# Altium schematic symbol library Analog Devices Data Converters Digital-to-Analog Converters.SchLib: 2231 symbols (part 80 of 135) (continued)
## AD5754RBREZ (continued)

## AD5754RBREZ-REEL7
designator U?
Quad 16-Bit Unipolar / Bipolar Voltage Output Digital-to-Analog Converter with Serial Interface, -40 to +85 degC, RE-24, Pb-Free, Reel; Generic Part Number: AD5754R; Manufacturer: Analog Devices; PartNumber: AD5754RBREZ-REEL7; # DAC Outputs: 4; Max V+: 16.5V; Op Pwr Diss: 310mW; Resolution (Bits): 16; Settling Time: 10µs; Single Supply: Yes; DatasheetVersion: Rev.E; PackageVersion: 050806-A; PackageReference: RE-24; PackageDescription: 24-Lead Thin Shrink Small Outline Package, Exposed Pad [TSSOP_EP]; Supplier 1: Digi-Key; Supplier Part Number 1: AD5754RBREZ-REEL7-ND; Supplier 2: Newark; Supplier Part Number 2: 51P3756; Supplier 3: Mouser; Supplier Part Number 3: 584-AD5754RBREZ-R7; Packing: Reel; RoHS: Y; Mounting Technology: Surface Mount; Code_JEDEC: MO-153-ADT; ComponentLink1Description: Manufacturer URL; ComponentLink1URL: http://www.analog.com/en/index.html; ComponentLink2Description: Datasheet; ComponentLink2URL: http://www.analog.com/static/imported-files/data_sheets/AD5724R_5734R_5754R.pdf; ComponentLink3Description: Package Specification; ComponentLink3URL: http://www.analog.com/static/imported-files/packages/PKG_PDF/TSSOP_EP(RE)/RE_24.pdf; ComponentLink4Description: Product URL; ComponentLink4URL: http://www.analog.com/en/digital-to-analog-converters/da-converters/ad5754r/products/product.html; ComponentLink5Description: Reference Design URL; ComponentLink5URL: http://www.analog.com/en/digital-to-analog-converters/da-converters/ad5754r/products/product.html#prod_cross_sell
footprint RE-24_N (TSOP, 24-Leads, Body 7.8x4.4mm, Pitch 0.65mm, Thermal pad 5.02x3.25 mm, IPC Medium Density)
footprint RE-24_L (TSOP, 24-Leads, Body 7.8x4.4mm, Pitch 0.65mm, Thermal pad 5.02x3.25 mm, IPC High Density)
footprint RE-24_M (TSOP, 24-Leads, Body 7.8x4.4mm, Pitch 0.65mm, Thermal pad 5.02x3.25 mm, IPC Low Density)
pins: 1 AVSS (power) "Negative Analog Supply Pin. Voltage range is from -4.5 V to -16.5 V. This pin can be connected to 0 V if output ranges are unipolar.", 2 NC "No Connect. Do not connect to these pins.", 3 VOUTA (out) "Analog Output Voltage of DAC A. The output amplifier is capable of directly driving a 2 kohm, 4000 pF load.", 4 VOUTB (out) "Analog Output Voltage of DAC B. The output amplifier is capable of directly driving a 2 kohm, 4000 pF load.", 5 BIN/~{2SCOMP} (in) "This pin determines the DAC coding for a bipolar output range. This pin should be hardwired to either DVCC or GND. When hardwired to DVCC, input coding is offset binary. When hardwired to GND, input coding is twos complement.(See Datasheet)", 6 NC "No Connect. Do not connect to these pins.", 7 ~{SYNC} (in) "Active Low Input. This is the frame Synchronization signal for the serial interface. While S\Y\N\C\ is low, data is transferred on the falling edge of SCLK. Data is latched on the rising edge of S\Y\N\C\.", 8 SCLK (in) "Serial Clock Input. Data is clocked into the shift register on the falling edge of SCLK. This operates at clock speeds up to 30 MHz.", 9 SDIN (in) "Serial Data Input. Data must be valid on the falling edge of SCLK.", 10 ~{LDAC} (in) "Load DAC, Logic Input. This is used to update the DAC registers and, consequently, the analog output. When tied permanently low, the addressed DAC register is updated on the rising edge of S\Y\N\C\. If L\D\A\C\ is held high (See Datasheet)", 11 ~{CLR} (in) "Active Low Input. Asserting this pin sets the DAC registers to zero-scale code or midscale code (user selectable).", 12 NC "No Connect. Do not connect to these pins.", 13 NC "No Connect. Do not connect to these pins.", 14 DVCC (power) "Digital Supply Pin. Voltage range is from 2.7 V to 5.5 V.", 15 GND (power) "Ground Reference Pin.", 16 SDO (out) "Serial Data Output. Used to clock data from the serial register in daisy-chain or readback mode. Data is clocked out on the rising edge of SCLK and is valid on the falling edge of SCLK.", 17 REFIN/REFOUT (io) "External Reference Voltage Input and Internal Reference Voltage Output. Reference input range is 2 V to 3 V. REFIN = 2.5 V for specified performance. REFOUT = 2.5 V +/- 2 mV 25degreesC.", 18 DAC_GND (power) "Ground reference pins for the four digital-to-analog converters.", 19 DAC_GND (power) "Ground reference pins for the four digital-to-analog converters.", 20 SIG_GND (power) "Ground reference pins for the four output amplifiers.", 21 SIG_GND (power) "Ground reference pins for the four output amplifiers.", 22 VOUTD (out) "Analog Output Voltage of DAC D. The output amplifier is capable of directly driving a 2 kohm, 4000 pF load.", 23 VOUTC (out) "Analog Output Voltage of DAC C. The output amplifier is capable of directly driving a 2 kohm, 4000 pF load.", 24 AVDD (power) "Positive Analog Supply Pin. Voltage range is from 4.5 V to 16.5 V.", 25 EP "The exposed paddle should be connected to the potential of the AVSS pin or, alternatively, it can be left electrically unconnected. It is recommended that the paddle be thermally connected to a copper plane for enhanced (See Datasheet)"

## AD5755-1ACPZ
designator U?
Quad 16-Bit Voltage Output Digital-to-Analog Converter with Serial Interface and HART Connectivity, 4 to 20 mA, -40 to +105 degC, CP-64-3, Pb-Free, Tray; Generic Part Number: AD5755-1; Manufacturer: Analog Devices; PartNumber: AD5755-1ACPZ; # DAC Outputs: 4; Max V+: 33V; Op Pwr Diss: 173mW; Resolution (Bits): 16; Settling Time: 11µs; Single Supply: No; DatasheetVersion: Rev.C; PackageVersion: 051007-C; PackageReference: CP-64-3; PackageDescription: 64-Lead Lead Frame Chip Scale Package [LFCSP_VQ] 9 x 9 mm Body, Very Thin Quad; Supplier 1: Digi-Key; Supplier Part Number 1: AD5755-1ACPZ-ND; Supplier 2: Farnell; Supplier Part Number 2: 1903595; Supplier 3: Newark; Supplier Part Number 3: 47T4695; Supplier 4: Mouser; Supplier Part Number 4: 584-AD5755-1ACPZ; Packing: Tray; RoHS: Y; Mounting Technology: Surface Mount; Code_JEDEC: MO-220-VMMD-4; ComponentLink1Description: Manufacturer URL; ComponentLink1URL: http://www.analog.com/en/index.html; ComponentLink2Description: Datasheet; ComponentLink2URL: http://www.analog.com/static/imported-files/data_sheets/AD5755-1.pdf; ComponentLink3Description: Package Specification; ComponentLink3URL: http://www.analog.com/static/imported-files/packages/PKG_PDF/LFCSP(CP)/CP_64_3.pdf; ComponentLink4Description: Product URL; ComponentLink4URL: http://www.analog.com/en/digital-to-analog-converters/da-converters/ad5755-1/products/product.html
footprint CP-64-3_N (QFN, 64-Leads, Body 9x9mm, Pitch 0.5mm, Thermal Pad 7.1x7.1mm, IPC Medium Density)
footprint CP-64-3_L (QFN, 64-Leads, Body 9x9mm, Pitch 0.5mm, Thermal Pad 7.1x7.1mm, IPC High Density)
footprint CP-64-3_M (QFN, 64-Leads, Body 9x9mm, Pitch 0.5mm, Thermal Pad 7.1x7.1mm, IPC Low Density)
part A pins: 1 RSET_B (in) "An external, precision, low drift 15 kohm current setting resistor can be connected to this pin to improve the IOUT_B  temperature drift performance. See the Device Features section.", 2 RSET_A (in) "An external, precision, low drift 15 kohm current setting resistor can be connected to this pin to improve the IOUT_A  temperature drift performance. See the Device Features section.", 20 COMPLV_A "Optional Compensation Capacitor Connection for VOUT_A Output Buffer. Connecting a 220 pF capacitor between  this pin and the VOUT_A pin allows the voltage output to drive up to 2 uF. Note that the addition of this capacitor  (See Datasheet)", 21 CHARTA (in) "HART Input Connection for DAC Channel A.", 22 +VSENSE_A (in) "Sense Connection for the Positive Voltage Output Load Connection for VOUT_A.", 23 COMPDCDC_A "DC-to-DC Compensation Capacitor. Connect a 10 nF capacitor from this pin to ground. Used to regulate the  feedback loop of the Channel A dc-to-dc converter. Alternatively, if using an external compensation resistor,  place a (See Datasheet)", 25 VOUT_A (hiz) "Buffered Analog Output Voltage for DAC Channel A.", 26 IOUT_A (hiz) "Current Output Pin for DAC Channel A.", 28 COMPLV_B "Optional Compensation Capacitor Connection for VOUT_B Output Buffer. Connecting a 220 pF capacitor between  this pin and the VOUT_B pin allows the voltage output to drive up to 2 uF. Note that the addition of this capacitor  (See Datasheet)", 29 CHARTB (in) "HART Input Connection for DAC Channel B.", 30 +VSENSE_B (in) "Sense Connection for the Positive Voltage Output Load Connection for VOUT_B.", 31 VOUT_B (hiz) "Buffered Analog Output Voltage for DAC Channel B.", 32 COMPDCDC_B "DC-to-DC Compensation Capacitor. Connect a 10 nF capacitor from this pin to ground. Used to regulate the  feedback loop of the Channel B dc-to-dc converter. Alternatively, if using an external compensation resistor,  place a (See Datasheet)", 33 IOUT_B (hiz) "Current Output Pin for DAC Channel B.", 36 SWB (out) "Switching Output for Channel B DC-to-DC Circuitry. To use the dc-to-dc feature of the device, connect as shown  in Figure 80.", 39 SWA (out) "Switching Output for Channel A DC-to-DC Circuitry. To use the dc-to-dc feature of the device, connect as shown  in Figure 80.", 41 SWD (out) "Switching Output for Channel D DC-DC Circuitry. To use the dc-to-dc feature of the device, connect as shown in  Figure 80.", 44 SWC (out) "Switching Output for Channel C DC-to-DC Circuitry. To use the dc-to-dc feature of the device, connect as shown in Figure 80.", 47 IOUT_C (hiz) "Current Output Pin for DAC Channel C.", 48 COMPDCDC_C "DC-to-DC Compensation Capacitor. Connect a 10 nF capacitor from this pin to ground. Used to regulate the  feedback loop of the Channel C dc-to-dc converter. Alternatively, if using an external compensation resistor,  place a (See Datasheet)", 49 VOUT_C (hiz) "Buffered Analog Output Voltage for DAC Channel C.", 50 +VSENSE_C (in) "Sense Connection for the Positive Voltage Output Load Connection for VOUT_C.", 51 CHARTC (in) "HART Input Connection for DAC Channel C.", 52 COMPLV_C "Optional Compensation Capacitor Connection for VOUT_C Output Buffer. Connecting a 220 pF capacitor between  this pin and the VOUT_C pin allows the voltage output to drive up to 2 uF. Note that the addition of this capacitor  (See Datasheet)", 54 IOUT_D (hiz) "Current Output Pin for DAC Channel D.", 55 VOUT_D (hiz) "Buffered Analog Output Voltage for DAC Channel D.", 57 COMPDCDC_D "DC-to-DC Compensation Capacitor. Connect a 10 nF capacitor from this pin to ground. Used to regulate the  feedback loop of the Channel D dc-to-dc converter. Alternatively, if using an external compensation resistor,  place a (See Datasheet)", 58 +VSENSE_D (in) "Sense Connection for the Positive Voltage Output Load Connection for VOUT_D.", 59 CHARTD (in) "HART Input Connection for DAC Channel D", 60 COMPLV_D "Optional Compensation Capacitor Connection for VOUT_D Output Buffer. Connecting a 220 pF capacitor between  this pin and the VOUT_D pin allows the voltage output to drive up to 2 uF. Note that the addition of this capacitor  (See Datasheet)", 63 RSET_D (in) "An external, precision, low drift 15 kohm current setting resistor can be connected to this pin to improve the IOUT_D  temperature drift performance. See the Device Features section.", 64 RSET_C (in) "An external, precision, low drift 15 kohm current setting resistor can be connected to this pin to improve the IOUT_C  temperature drift performance. See the Device Features section."
part B pins: 5 AD0 (in) "Address Decode for the Device Under Test (DUT) on the Board.", 6 AD1 (in) "Address Decode for the DUT on the Board.", 7 ~{SYNC} (in) "Active Low Input. This is the frame synchronization signal for the serial interface. While S\Y\N\C\ is low, data is  transferred in on the falling edge of SCLK.", 8 SCLK (in) "Serial Clock Input. Data is clocked into the input shift register on the falling edge of SCLK. This operates at clock  speeds of up to 30 MHz.", 9 SDIN (in) "Serial Data Input. Data must be valid on the falling edge of SCLK.", 10 SDO (out) "Serial Data Output. Used to clock data from the serial register in readback mode. See Figure 4 and Figure 5.", 13 ~{LDAC} (in) "Load DAC, Active Low Input. This is used to update the DAC register and consequently the DAC outputs. When  tied permanently low, the addressed DAC data register is updated on the rising edge of S\Y\N\C\. If L\D\A\C\ is held (See Datasheet)", 14 CLEAR (in) "Active High, Edge Sensitive Input. Asserting this pin sets the output current and voltage to the preprogrammed  clear code bit setting. Only channels enabled to be cleared are cleared. See the Device Features section for (See Datasheet)", 15 ALERT (out) "Active High Output. This pin is asserted when there has been no SPI activity on the interface pins for a  predetermined time. See the Device Features section for more information.", 16 ~{FAULT} (oc) "Active Low Output. This pin is asserted low when an open circuit in current mode is detected, a short circuit in  voltage mode is detected, a PEC error is detected, or an overtemperature is detected (see the Device Features  (See Datasheet)", 17 POC (in) "Power-On Condition. This pin determines the power-on condition and is read during power-on or, alternatively,  after a device reset. If POC = 0, the device is powered up with the voltage and current channels in tristate mode.(See Datasheet)", 18 ~{RESET} (in) "Hardware Reset, Active Low Input.", 61 REFIN (in) "External Reference Voltage Input.", 62 REFOUT (out) "Internal Reference Voltage Output. It is recommended to place a 0.1 uF capacitor between REFOUT and  REFGND.REFOUT must be connected to REFIN to use the internal reference."
part C pins: 3 REFGND (power) "Ground Reference Point for Internal Reference.", 4 REFGND (power) "Ground Reference Point for Internal Reference.", 11 DVDD (power) "Digital Supply. The voltage range is from 2.7 V to 5.5 V.", 12 DGND (power) "Digital Ground.", 19 AVDD (power) "Positive Analog Supply. The voltage range is from 9 V to 33 V.", 24 VBOOST_A (power) "Supply for Channel A Current Output Stage (see Figure 73). This is also the supply for the VOUT_x stage, which is  regulated to 15 V by the dc-to-dc converter. To use the dc-to-dc feature of the device, connect as shown in  (See Datasheet)", 27 AVSS (power) "Negative Analog Supply. Voltage range is from -10.8 V to -26.4 V.", 34 VBOOST_B (power) "Supply for Channel B Current Output Stage (see Figure 73). This is also the supply for the VOUT_x stage, which is  regulated to 15 V by the dc-to-dc converter. To use the dc-to-dc feature of the device, connect as shown in  (See Datasheet)", 35 AGND (power) "Ground Reference Point for Analog Circuitry. This must be connected to 0 V.", 37 GNDSWB (power) "Ground Connection for DC-to-DC Switching Circuit. This pin should always be connected to ground.", 38 GNDSWA (power) "Ground Connection for DC-to-DC Switching Circuit. This pin should always be connected to ground.", 40 AVSS (power) "Negative Analog Supply Pin. The voltage range is from -10.8 V to -26.4 V. This pin can be connected to 0 V if  using the device in unipolar supply mode.", 42 GNDSWD (power) "Ground Connections for DC-to-DC Switching Circuit. This pin should always be connected to ground.", 43 GNDSWC (power) "Ground Connections for DC-to-DC Switching Circuit. This pin should always be connected to ground.", 45 AVCC (power) "Supply for DC-to-DC Circuitry.", 46 VBOOST_C (power) "Supply for Channel C Current Output Stage (see Figure 73). This is also the supply for the VOUT_x stage, which is  regulated to 15 V by the dc-to-dc converter. To use the dc-to-dc feature of the device, connect as shown in  (See Datasheet)", 53 AVSS (power) "Negative Analog Supply Pin.", 56 VBOOST_D (power) "Supply for Channel D Current Output Stage (see Figure 73). This is also the supply for the VOUT_x stage, which is  regulated to 15 V by the dc-to-dc converter. To use the dc-to-dc feature of the device, connect as shown in  (See Datasheet)", 65 EP (power) "Exposed Pad. This exposed pad should be connected to the potential of the AVSS pin, or, alternatively, it can be  left electrically unconnected. It is recommended that the pad be thermally connected to a copper plane for  (See Datasheet)"

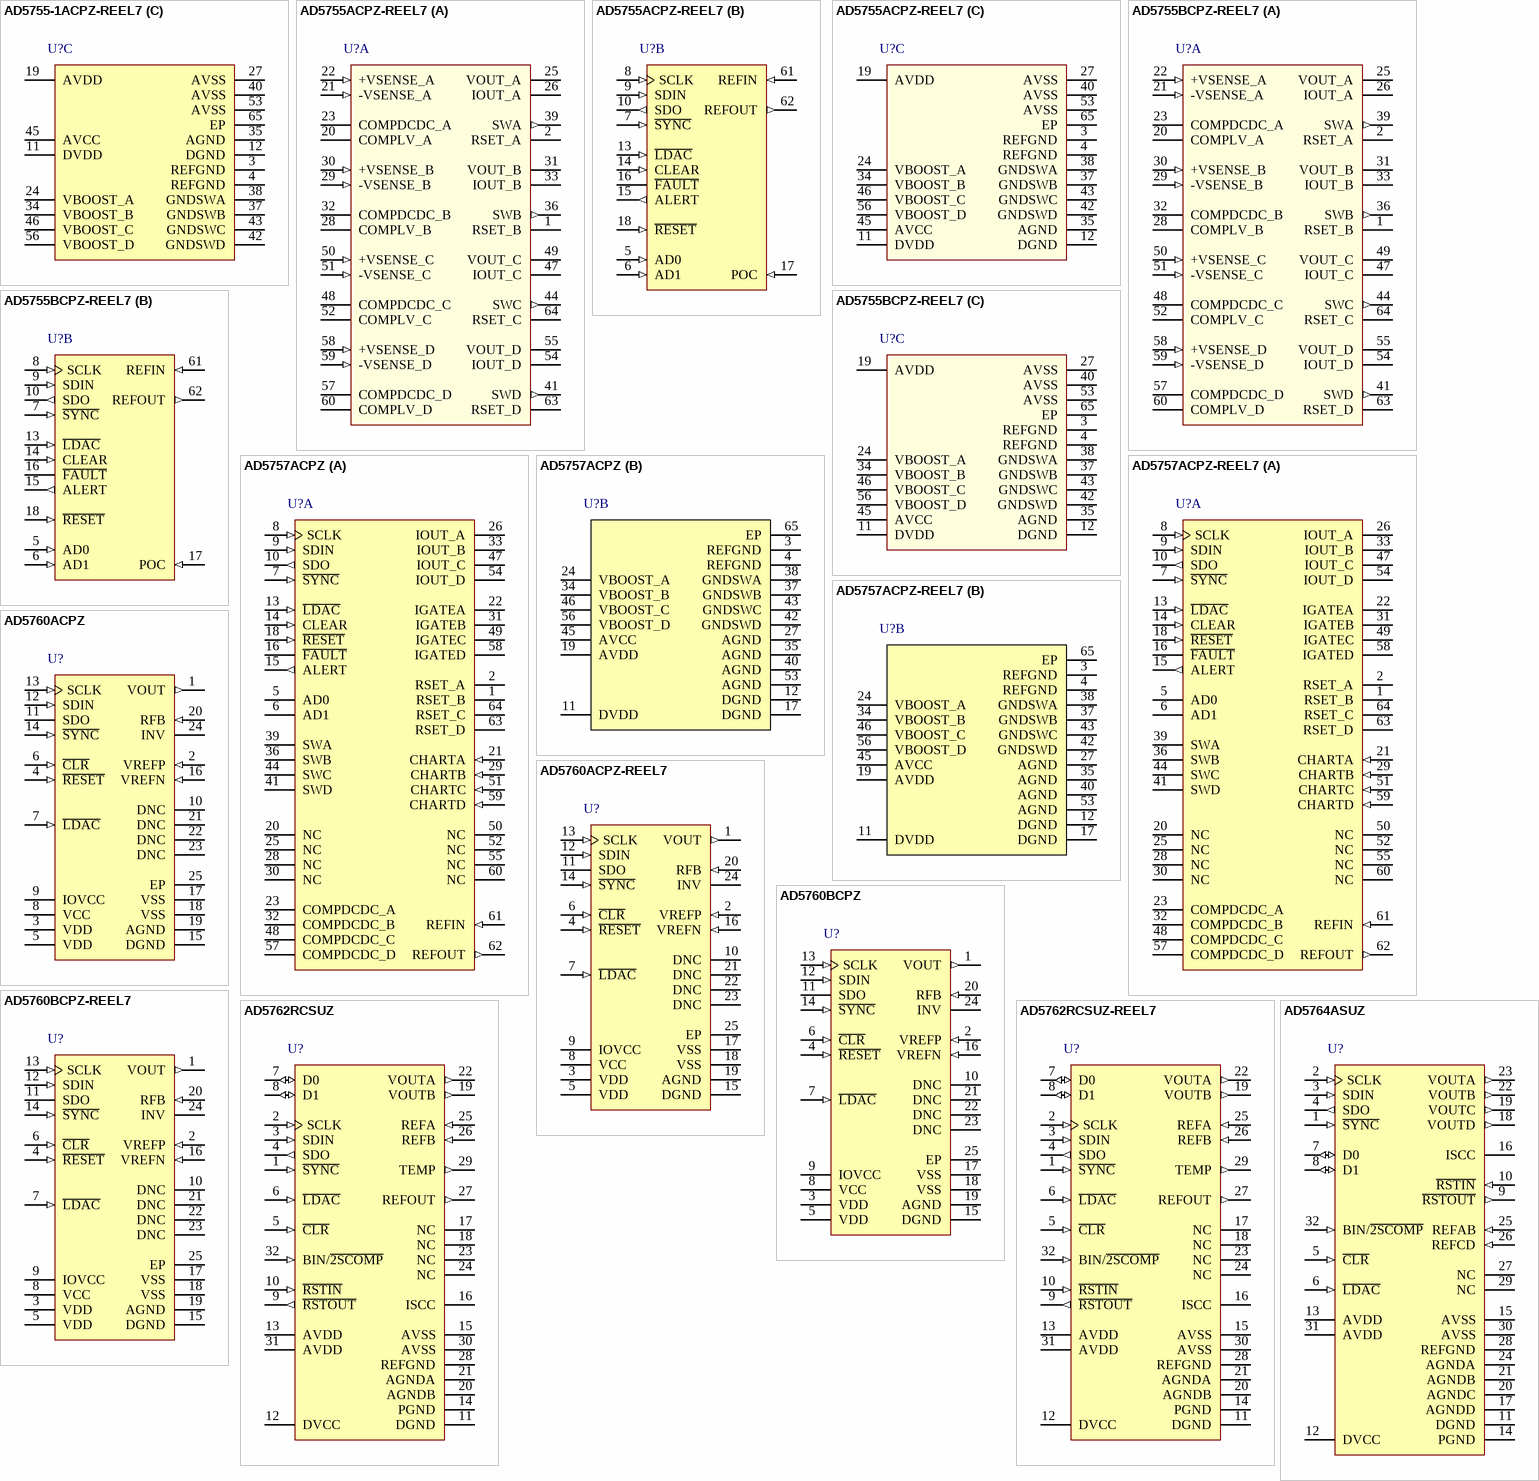
[diagram p56: symbols AD5755-1ACPZ-REEL7 to AD5764ASUZ]

## AD5755-1ACPZ-REEL7
designator U?
Quad 16-Bit Voltage Output Digital-to-Analog Converter with Serial Interface and HART Connectivity, 4 to 20 mA, -40 to +105 degC, CP-64-3, Pb-Free, Reel; Generic Part Number: AD5755-1; Manufacturer: Analog Devices; PartNumber: AD5755-1ACPZ-REEL7; # DAC Outputs: 4; Max V+: 33V; Op Pwr Diss: 173mW; Resolution (Bits): 16; Settling Time: 11µs; Single Supply: No; DatasheetVersion: Rev.C; PackageVersion: 051007-C; PackageReference: CP-64-3; PackageDescription: 64-Lead Lead Frame Chip Scale Package [LFCSP_VQ] 9 x 9 mm Body, Very Thin Quad; Supplier 1: Digi-Key; Supplier Part Number 1: AD5755-1ACPZ-REEL7-ND; Supplier 2: Mouser; Supplier Part Number 2: 584-AD5755-1ACPZR7; Packing: Reel; RoHS: Y; Mounting Technology: Surface Mount; Code_JEDEC: MO-220-VMMD-4; ComponentLink1Description: Manufacturer URL; ComponentLink1URL: http://www.analog.com/en/index.html; ComponentLink2Description: Datasheet; ComponentLink2URL: http://www.analog.com/static/imported-files/data_sheets/AD5755-1.pdf; ComponentLink3Description: Package Specification; ComponentLink3URL: http://www.analog.com/static/imported-files/packages/PKG_PDF/LFCSP(CP)/CP_64_3.pdf; ComponentLink4Description: Product URL; ComponentLink4URL: http://www.analog.com/en/digital-to-analog-converters/da-converters/ad5755-1/products/product.html
footprint CP-64-3_N (QFN, 64-Leads, Body 9x9mm, Pitch 0.5mm, Thermal Pad 7.1x7.1mm, IPC Medium Density)
footprint CP-64-3_L (QFN, 64-Leads, Body 9x9mm, Pitch 0.5mm, Thermal Pad 7.1x7.1mm, IPC High Density)
footprint CP-64-3_M (QFN, 64-Leads, Body 9x9mm, Pitch 0.5mm, Thermal Pad 7.1x7.1mm, IPC Low Density)
part A pins: 1 RSET_B (in) "An external, precision, low drift 15 kohm current setting resistor can be connected to this pin to improve the IOUT_B  temperature drift performance. See the Device Features section.", 2 RSET_A (in) "An external, precision, low drift 15 kohm current setting resistor can be connected to this pin to improve the IOUT_A  temperature drift performance. See the Device Features section.", 20 COMPLV_A "Optional Compensation Capacitor Connection for VOUT_A Output Buffer. Connecting a 220 pF capacitor between  this pin and the VOUT_A pin allows the voltage output to drive up to 2 uF. Note that the addition of this capacitor  (See Datasheet)", 21 CHARTA (in) "HART Input Connection for DAC Channel A.", 22 +VSENSE_A (in) "Sense Connection for the Positive Voltage Output Load Connection for VOUT_A.", 23 COMPDCDC_A "DC-to-DC Compensation Capacitor. Connect a 10 nF capacitor from this pin to ground. Used to regulate the  feedback loop of the Channel A dc-to-dc converter. Alternatively, if using an external compensation resistor,  place a (See Datasheet)", 25 VOUT_A (hiz) "Buffered Analog Output Voltage for DAC Channel A.", 26 IOUT_A (hiz) "Current Output Pin for DAC Channel A.", 28 COMPLV_B "Optional Compensation Capacitor Connection for VOUT_B Output Buffer. Connecting a 220 pF capacitor between  this pin and the VOUT_B pin allows the voltage output to drive up to 2 uF. Note that the addition of this capacitor  (See Datasheet)", 29 CHARTB (in) "HART Input Connection for DAC Channel B.", 30 +VSENSE_B (in) "Sense Connection for the Positive Voltage Output Load Connection for VOUT_B.", 31 VOUT_B (hiz) "Buffered Analog Output Voltage for DAC Channel B.", 32 COMPDCDC_B "DC-to-DC Compensation Capacitor. Connect a 10 nF capacitor from this pin to ground. Used to regulate the  feedback loop of the Channel B dc-to-dc converter. Alternatively, if using an external compensation resistor,  place a (See Datasheet)", 33 IOUT_B (hiz) "Current Output Pin for DAC Channel B.", 36 SWB (out) "Switching Output for Channel B DC-to-DC Circuitry. To use the dc-to-dc feature of the device, connect as shown  in Figure 80.", 39 SWA (out) "Switching Output for Channel A DC-to-DC Circuitry. To use the dc-to-dc feature of the device, connect as shown  in Figure 80.", 41 SWD (out) "Switching Output for Channel D DC-DC Circuitry. To use the dc-to-dc feature of the device, connect as shown in  Figure 80.", 44 SWC (out) "Switching Output for Channel C DC-to-DC Circuitry. To use the dc-to-dc feature of the device, connect as shown in Figure 80.", 47 IOUT_C (hiz) "Current Output Pin for DAC Channel C.", 48 COMPDCDC_C "DC-to-DC Compensation Capacitor. Connect a 10 nF capacitor from this pin to ground. Used to regulate the  feedback loop of the Channel C dc-to-dc converter. Alternatively, if using an external compensation resistor,  place a (See Datasheet)", 49 VOUT_C (hiz) "Buffered Analog Output Voltage for DAC Channel C.", 50 +VSENSE_C (in) "Sense Connection for the Positive Voltage Output Load Connection for VOUT_C.", 51 CHARTC (in) "HART Input Connection for DAC Channel C.", 52 COMPLV_C "Optional Compensation Capacitor Connection for VOUT_C Output Buffer. Connecting a 220 pF capacitor between  this pin and the VOUT_C pin allows the voltage output to drive up to 2 uF. Note that the addition of this capacitor  (See Datasheet)", 54 IOUT_D (hiz) "Current Output Pin for DAC Channel D.", 55 VOUT_D (hiz) "Buffered Analog Output Voltage for DAC Channel D.", 57 COMPDCDC_D "DC-to-DC Compensation Capacitor. Connect a 10 nF capacitor from this pin to ground. Used to regulate the  feedback loop of the Channel D dc-to-dc converter. Alternatively, if using an external compensation resistor,  place a (See Datasheet)", 58 +VSENSE_D (in) "Sense Connection for the Positive Voltage Output Load Connection for VOUT_D.", 59 CHARTD (in) "HART Input Connection for DAC Channel D", 60 COMPLV_D "Optional Compensation Capacitor Connection for VOUT_D Output Buffer. Connecting a 220 pF capacitor between  this pin and the VOUT_D pin allows the voltage output to drive up to 2 uF. Note that the addition of this capacitor  (See Datasheet)", 63 RSET_D (in) "An external, precision, low drift 15 kohm current setting resistor can be connected to this pin to improve the IOUT_D  temperature drift performance. See the Device Features section.", 64 RSET_C (in) "An external, precision, low drift 15 kohm current setting resistor can be connected to this pin to improve the IOUT_C  temperature drift performance. See the Device Features section."
part B pins: 5 AD0 (in) "Address Decode for the Device Under Test (DUT) on the Board.", 6 AD1 (in) "Address Decode for the DUT on the Board.", 7 ~{SYNC} (in) "Active Low Input. This is the frame synchronization signal for the serial interface. While S\Y\N\C\ is low, data is  transferred in on the falling edge of SCLK.", 8 SCLK (in) "Serial Clock Input. Data is clocked into the input shift register on the falling edge of SCLK. This operates at clock  speeds of up to 30 MHz.", 9 SDIN (in) "Serial Data Input. Data must be valid on the falling edge of SCLK.", 10 SDO (out) "Serial Data Output. Used to clock data from the serial register in readback mode. See Figure 4 and Figure 5.", 13 ~{LDAC} (in) "Load DAC, Active Low Input. This is used to update the DAC register and consequently the DAC outputs. When  tied permanently low, the addressed DAC data register is updated on the rising edge of S\Y\N\C\. If L\D\A\C\ is held (See Datasheet)", 14 CLEAR (in) "Active High, Edge Sensitive Input. Asserting this pin sets the output current and voltage to the preprogrammed  clear code bit setting. Only channels enabled to be cleared are cleared. See the Device Features section for (See Datasheet)", 15 ALERT (out) "Active High Output. This pin is asserted when there has been no SPI activity on the interface pins for a  predetermined time. See the Device Features section for more information.", 16 ~{FAULT} (oc) "Active Low Output. This pin is asserted low when an open circuit in current mode is detected, a short circuit in  voltage mode is detected, a PEC error is detected, or an overtemperature is detected (see the Device Features  (See Datasheet)", 17 POC (in) "Power-On Condition. This pin determines the power-on condition and is read during power-on or, alternatively,  after a device reset. If POC = 0, the device is powered up with the voltage and current channels in tristate mode.(See Datasheet)", 18 ~{RESET} (in) "Hardware Reset, Active Low Input.", 61 REFIN (in) "External Reference Voltage Input.", 62 REFOUT (out) "Internal Reference Voltage Output. It is recommended to place a 0.1 uF capacitor between REFOUT and  REFGND.REFOUT must be connected to REFIN to use the internal reference."
part C pins: 3 REFGND (power) "Ground Reference Point for Internal Reference.", 4 REFGND (power) "Ground Reference Point for Internal Reference.", 11 DVDD (power) "Digital Supply. The voltage range is from 2.7 V to 5.5 V.", 12 DGND (power) "Digital Ground.", 19 AVDD (power) "Positive Analog Supply. The voltage range is from 9 V to 33 V.", 24 VBOOST_A (power) "Supply for Channel A Current Output Stage (see Figure 73). This is also the supply for the VOUT_x stage, which is  regulated to 15 V by the dc-to-dc converter. To use the dc-to-dc feature of the device, connect as shown in  (See Datasheet)", 27 AVSS (power) "Negative Analog Supply. Voltage range is from -10.8 V to -26.4 V.", 34 VBOOST_B (power) "Supply for Channel B Current Output Stage (see Figure 73). This is also the supply for the VOUT_x stage, which is  regulated to 15 V by the dc-to-dc converter. To use the dc-to-dc feature of the device, connect as shown in  (See Datasheet)", 35 AGND (power) "Ground Reference Point for Analog Circuitry. This must be connected to 0 V.", 37 GNDSWB (power) "Ground Connection for DC-to-DC Switching Circuit. This pin should always be connected to ground.", 38 GNDSWA (power) "Ground Connection for DC-to-DC Switching Circuit. This pin should always be connected to ground.", 40 AVSS (power) "Negative Analog Supply Pin. The voltage range is from -10.8 V to -26.4 V. This pin can be connected to 0 V if  using the device in unipolar supply mode.", 42 GNDSWD (power) "Ground Connections for DC-to-DC Switching Circuit. This pin should always be connected to ground.", 43 GNDSWC (power) "Ground Connections for DC-to-DC Switching Circuit. This pin should always be connected to ground.", 45 AVCC (power) "Supply for DC-to-DC Circuitry.", 46 VBOOST_C (power) "Supply for Channel C Current Output Stage (see Figure 73). This is also the supply for the VOUT_x stage, which is  regulated to 15 V by the dc-to-dc converter. To use the dc-to-dc feature of the device, connect as shown in  (See Datasheet)", 53 AVSS (power) "Negative Analog Supply Pin.", 56 VBOOST_D (power) "Supply for Channel D Current Output Stage (see Figure 73). This is also the supply for the VOUT_x stage, which is  regulated to 15 V by the dc-to-dc converter. To use the dc-to-dc feature of the device, connect as shown in  (See Datasheet)", 65 EP (power) "Exposed Pad. This exposed pad should be connected to the potential of the AVSS pin, or, alternatively, it can be  left electrically unconnected. It is recommended that the pad be thermally connected to a copper plane for  (See Datasheet)"